# Altium footprint library Module.PcbLib: 57 footprints (part 2 of 4)
Each footprint in its own frame and in the unit in brackets; x right, y up, seen from the top. Pads: shape width x height; smd on the part's side, far side on the other; paste and mask are expansions set on the pad; w line width, h text height; cw(c..) or ccw(c..) is an arc to the next point about the centre after c.
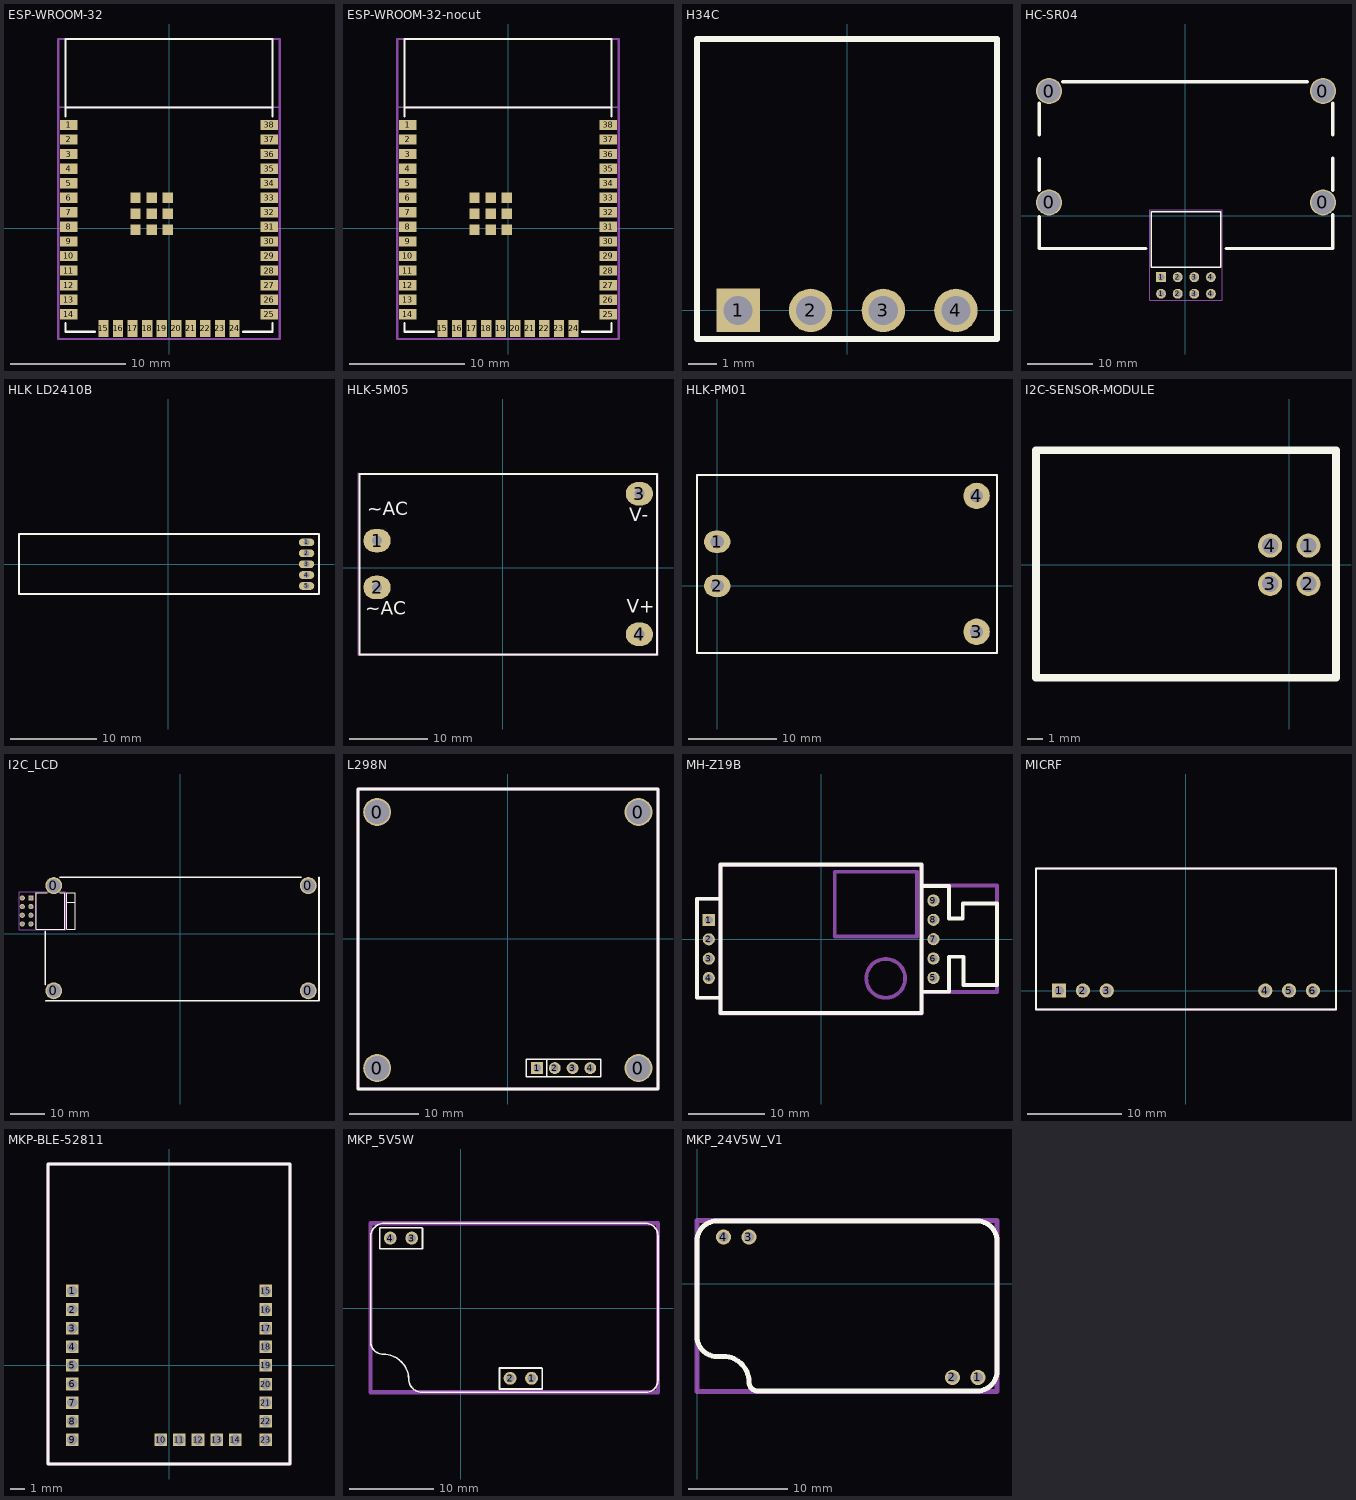
[diagram p1: the footprints below, top view; thin cyan lines are the x and y axes]

## ESP-WROOM-32 [mm]
height 2.8
pads (47):
  rect 1.5x0.9 smd: 1(-8.75,9) 2(-8.75,7.73) 3(-8.75,6.46) 4(-8.75,5.19) 5(-8.75,3.92) 6(-8.75,2.65) 7(-8.75,1.38) 8(-8.75,0.11) 9(-8.75,-1.16) 10(-8.75,-2.43) 11(-8.75,-3.7) 12(-8.75,-4.97) 13(-8.75,-6.24) 14(-8.75,-7.51) 25(8.75,-7.51) 26(8.75,-6.24) 27(8.75,-4.97) 28(8.75,-3.7) 29(8.75,-2.43) 30(8.75,-1.16) 31(8.75,0.11) 32(8.75,1.38) 33(8.75,2.65) 34(8.75,3.92) 35(8.75,5.19) 36(8.75,6.46) 37(8.75,7.73) 38(8.75,9)
  rect 0.9x1.5 smd: 15(-5.717,-8.75) 16(-4.447,-8.75) 17(-3.177,-8.75) 18(-1.907,-8.75) 19(-0.637,-8.75) 20(0.633,-8.75) 21(1.903,-8.75) 22(3.173,-8.75) 23(4.443,-8.75) 24(5.713,-8.75)
  rect 0.9x0.9 smd paste-6: 101(-2.917,-0.144) 101(-2.917,1.256) 101(-2.917,2.656) 101(-1.517,-0.144) 101(-1.517,1.256) 101(-1.517,2.656) 101(-0.117,-0.144) 101(-0.117,1.256) 101(-0.117,2.656)
Top Overlay:
  lines w0.2: -9.017,-8.272 -9.017,-9.034 -6.477,-9.034 ; -9.017,9.762 -9.017,16.493 9.017,16.493 9.017,9.762 ; -9.017,10.524 9.017,10.524 ; 6.477,-9.034 9.017,-9.034 9.017,-8.272
Mechanical 1:
  lines w0.127: -9.652,10.524 9.652,10.524
Mechanical 13:
  lines w0.2: -9.652,-9.669 9.652,-9.669 9.652,16.493 -9.652,16.493 -9.652,-9.669
  text ".Designator" at 0.7,-3.6 h2
3D body "ESP-32 .step": height 2.61, standoff -0.1, extent -8.85,-8.9 9.05,16.5

## ESP-WROOM-32-nocut [mm]
height 2.8
pads (47):
  rect 1.5x0.9 smd: 1(-8.75,9) 2(-8.75,7.73) 3(-8.75,6.46) 4(-8.75,5.19) 5(-8.75,3.92) 6(-8.75,2.65) 7(-8.75,1.38) 8(-8.75,0.11) 9(-8.75,-1.16) 10(-8.75,-2.43) 11(-8.75,-3.7) 12(-8.75,-4.97) 13(-8.75,-6.24) 14(-8.75,-7.51) 25(8.75,-7.51) 26(8.75,-6.24) 27(8.75,-4.97) 28(8.75,-3.7) 29(8.75,-2.43) 30(8.75,-1.16) 31(8.75,0.11) 32(8.75,1.38) 33(8.75,2.65) 34(8.75,3.92) 35(8.75,5.19) 36(8.75,6.46) 37(8.75,7.73) 38(8.75,9)
  rect 0.9x1.5 smd: 15(-5.717,-8.75) 16(-4.447,-8.75) 17(-3.177,-8.75) 18(-1.907,-8.75) 19(-0.637,-8.75) 20(0.633,-8.75) 21(1.903,-8.75) 22(3.173,-8.75) 23(4.443,-8.75) 24(5.713,-8.75)
  rect 0.9x0.9 smd: 101(-2.917,-0.144) 101(-2.917,1.256) 101(-2.917,2.656) 101(-1.517,-0.144) 101(-1.517,1.256) 101(-1.517,2.656) 101(-0.117,-0.144) 101(-0.117,1.256) 101(-0.117,2.656)
Top Overlay:
  lines w0.2: -9.017,-8.272 -9.017,-9.034 -6.477,-9.034 ; -9.017,9.762 -9.017,16.493 9.017,16.493 9.017,9.762 ; -9.017,10.524 9.017,10.524 ; 6.477,-9.034 9.017,-9.034 9.017,-8.272
Mechanical 1:
  lines w0.127: -9.652,10.524 9.652,10.524
Mechanical 13:
  lines w0.2: -9.652,-9.669 -9.652,16.493 9.652,16.493 9.652,-9.669 -9.652,-9.669
  text ".Designator" at 0.7,-3.6 h2
3D body "ESP-32 .step": height 2.61, standoff -0.1, extent -8.85,-8.9 9.05,16.5

## H34C [mm]
pads (4):
  rect 1.52x1.52 hole 1.02: 1(-3.81,0)
  round 1.52 hole 1.02: 2(-1.27,0) 3(1.27,0) 4(3.81,0)
Top Overlay:
  lines w0.2: -5.25,-1 -5.25,9.5 5.25,9.5 5.25,-1 -5.25,-1
Mechanical 13:
  lines w0.2: -5.25,-1 5.25,-1 5.25,9.5 -5.25,9.5 -5.25,-1
Mechanical 15:
  lines w0.2: -5.25,-1 -5.25,9.5 5.25,9.5 5.25,-1 -5.25,-1
3D body: height 1.5, standoff 0, extent -5.2,-1 5.2,9.5

## HC-SR04 [mm]
pads (12):
  round 4 hole 3.5: 0(-20.85,2.012) 0(-20.85,19.075) 0(21.112,2.012) 0(21.112,19.075)
  round 1.52 hole 1.02: 1(-3.679,-11.981) 2(-1.139,-11.981) 2(-1.139,-9.441) 3(1.401,-11.981) 3(1.401,-9.441) 4(3.941,-11.981) 4(3.941,-9.441)
  rect 1.52x1.52 hole 1.02: 1(-3.679,-9.441)
Top Overlay:
  lines w0.2: -5.203,-7.917 5.465,-7.917 5.465,0.605 -5.203,0.605 -5.203,-7.917
  lines w0.5: -22.369,-0.145 -22.369,-5.066 -6,-5.066 ; -22.369,3.829 -22.369,8.75 ; -22.369,12.329 -22.369,17.25 ; -18.75,20.5 18.75,20.5 ; 6.25,-5.066 22.631,-5.066 22.631,0.105 ; 22.632,3.837 22.632,8.758 ; 22.632,12.337 22.632,17.258
Mechanical 15:
  lines w0.1: -5.449,-12.941 5.715,-12.941 5.715,0.855 -5.449,0.855 -5.449,-12.941
3D body "613008243121.stp": height 5.09, standoff -4.46, extent -5.199,-12.235 5.461,0.605
3D body "HC-04HC-04.stp": height 18.2, standoff 0.75, extent -22.369,-5.066 22.631,20.5

## HLK LD2410B [mm]
pads (5):
  oval 1.8x0.9 hole 0.7: 1(16.1,2.52) 2(16.1,1.25) 3(16.1,-0.02) 4(16.1,-1.29) 5(16.1,-2.56)
Top Overlay:
  lines w0.2: -17.4,-3.5 -17.4,3.5 17.55,3.5 17.55,-3.5 -17.4,-3.5
3D body: height 4.6, standoff 0, extent -17.4,-3.5 17.5,3.5

## HLK-5M05 [mm]
pads (4):
  oval 3.5x3 hole 1.3 paste+0 mask+0.051: 1(-16.105,3.508) 2(-16.105,-2.492) 3(17.495,9.508) 4(17.495,-8.492)
Top Overlay:
  lines w0.254: 19.745,-11.049 -18.355,-11.049 -18.355,12.008 19.745,12.008 19.745,-10.992
  text "V+" at 15.873,-6.336 h3
  text "V-" at 16.163,5.414 h3
  text "~AC" at -17.362,6.163 h3
  text "~AC" at -17.612,-6.587 h3
Mechanical 15:
  region: -18.422,12.135 -18.422,12.16 -18.457,12.195 -18.507,12.195 -18.542,12.16 -18.542,12.135 -18.542,12.11 -18.507,12.075 -18.457,12.075 -18.422,12.11
  region: -15.605,3.508 -15.606,3.607 -15.682,3.79 -15.823,3.93 -16.006,4.005 -16.204,4.005 -16.387,3.93 -16.528,3.79 -16.604,3.607 -16.605,3.508 -16.604,3.409 -16.528,3.226 -16.387,3.086 -16.204,3.011 -16.006,3.011 -15.823,3.086 -15.682,3.226 -15.606,3.409
  region: -15.605,-2.492 -15.606,-2.393 -15.682,-2.21 -15.823,-2.07 -16.006,-1.995 -16.204,-1.995 -16.387,-2.07 -16.528,-2.21 -16.604,-2.393 -16.605,-2.492 -16.604,-2.591 -16.528,-2.774 -16.387,-2.914 -16.204,-2.989 -16.006,-2.989 -15.823,-2.914 -15.682,-2.774 -15.606,-2.591
  region: 17.995,9.508 17.994,9.607 17.918,9.79 17.777,9.93 17.594,10.005 17.396,10.005 17.212,9.93 17.072,9.79 16.995,9.607 16.995,9.508 16.995,9.409 17.072,9.226 17.212,9.086 17.396,9.011 17.594,9.011 17.777,9.086 17.918,9.226 17.994,9.409
  region: 17.995,-8.492 17.994,-8.393 17.918,-8.21 17.777,-8.07 17.594,-7.995 17.396,-7.995 17.212,-8.07 17.072,-8.21 16.995,-8.393 16.995,-8.492 16.995,-8.591 17.072,-8.774 17.212,-8.914 17.396,-8.989 17.594,-8.989 17.777,-8.914 17.918,-8.774 17.994,-8.591
  lines w0.051: -18.482,-11.176 -18.482,12.135 19.872,12.135 19.872,-11.176 -18.482,-11.176
3D body "Convertidor AC DC HLK-5M05 .step": height 19.15, standoff -4.15, extent -18.605,-11.049 19.995,12.251

## HLK-5M12 [mm]

## HLK-PM01 [mm]
pads (4):
  oval 3x2.5 hole 1.5: 1(0,5) 2(0,0)
  round 3 hole 1.5: 3(29.4,-5.2) 4(29.4,10.2)
Top Overlay:
  lines w0.254: -2.286,-7.62 31.714,-7.62 31.714,12.58 -2.286,12.58 -2.286,-7.62
Mechanical 13:
  lines w0.254: -2.286,-7.62 -2.286,12.58 31.714,12.58 31.714,-7.62 -2.286,-7.62
  text ".Designator" at 0,0 h3.05
Mechanical 15:
  lines w0.254: -2.286,-7.62 -2.286,12.58 31.714,12.58 31.714,-7.62 -2.286,-7.62
  text ".Comment" at 0,0 h0.64
3D body "User Library-HLK-PM01.STEP": height 15.6, standoff -4.5, extent -2.25,-7.56 31.75,12.64

## I2C-SENSOR-MODULE [mm]
pads (4):
  round 1.6 hole 1.1: 1(1.27,1.27) 2(1.27,-1.27) 3(-1.27,-1.27) 4(-1.27,1.27)
Top Overlay:
  lines w0.5: -16.8,-7.5 3.1,-7.5 3.1,7.6 -16.8,7.6 -16.8,-7.5
3D body "PCB.step": height 5.9, standoff -5.64, extent -16.85,-7.45 3.15,7.55

## I2C_LCD [mm]
pads (13):
  round 5 hole 4: 0(-37.282,-16.79) 0(-37.282,14.21) 0(37.718,-16.79) 0(37.718,14.21)
  round 1.52 hole 1.02: 1(-46.564,10.56) 2(-46.564,8.02) 2(-44.024,8.02) 3(-46.564,5.48) 3(-44.024,5.48) 4(-46.564,2.94) 4(-44.024,2.94)
  rect 1.52x1.52 hole 1.02: 1(-44.024,10.56)
  round 0 all layers, no hole: ""(-39.657,13.21)
Top Overlay:
  lines w0.2: -39.155,12.084 -42.5,12.084 -42.5,1.416 -33.978,1.416 -33.978,12.08 -33.982,12.084 -35.5,12.084 ; -33.52,9.29 -30.98,9.29 ; -33.52,1.42 -33.52,12.08 -30.98,12.08 -30.98,1.42 -33.52,1.42
  lines w0.5: -39.782,-15 -39.782,0.75 ; -35.5,16.71 35.625,16.71 ; 40.864,-19.739 40.853,-19.75 ; 40.875,16.71 40.875,-18.5 40.875,-19.728 40.853,-19.75 ; -39.647,-19.75 -35.5,-19.75 36.125,-19.75 40.853,-19.75 ; -39.647,-19.75 -39.647,-19.75
Mechanical 15:
  lines w0.1: -42.54,1.485 -42.54,12.145 ; -47.524,1.166 -47.524,12.33 -33.728,12.33 -33.728,1.166 -47.524,1.166
3D body "I2C LCD Adapter PCF8574.SLDPRT": height 14.3, standoff 1.15, extent -33.575,-1.9 7.925,16.1
3D body "LCD module 16 X 2 backlight.STEP": height 20.52, standoff 7.31, extent -39.647,-19.75 40.853,16.75
3D body "61300411021.stp": height 11.54, standoff 1.18, extent -36.52,1.67 -30.98,11.83
3D body "613008243121.stp": height 5.09, standoff -4.46, extent -46.818,1.42 -33.978,12.08

## L298N [mm]
pads (8):
  round 4 hole 3.5: 0(-18.75,-18.5) 0(-18.75,18.2) 0(18.7,-18.5) 0(18.7,18.2)
  rect 1.7x1.7 hole 1.1: 1(4.17,-18.5)
  round 1.7 hole 1.1: 2(6.71,-18.5) 3(9.25,-18.5) 4(11.79,-18.5)
Top Overlay:
  lines w0.2: 5.52,-19.77 5.52,-17.23 ; 2.65,-19.77 13.31,-19.77 13.31,-17.23 2.65,-17.23 2.65,-19.77
  lines w0.5: -21.5,-21.5 21.5,-21.5 21.5,21.5 -21.5,21.5 -21.5,-21.5
Mechanical 1:
  lines w0.5: -21.5,-21.5 21.5,-21.5 21.5,21.5 -21.5,21.5 -21.5,-21.5
3D body "61300411821.stp": height 8.51, standoff -3.09, extent 2.65,-19.75 13.31,-17.25
3D body "L298N Driver DC Motor, Stepper Motor.STEP": height 35.71, standoff 7.71, extent -21.5,-21.5 21.5,21.5

## MH-Z19B [mm]
pads (9):
  rect 1.6x1.6 hole 1.1: 1(-14.75,2.52)
  round 1.6 hole 1.1: 2(-14.75,-0.02) 3(-14.75,-2.56) 4(-14.75,-5.1) 5(14.75,-5.08) 6(14.75,-2.54) 7(14.75,0) 8(14.75,2.54) 9(14.75,5.08)
Top Overlay:
  lines w0.5: -13.2,-7.7 -16.3,-7.7 -16.3,5.3 -13.2,5.3 ; 13.2,-6.9 16.8,-6.9 16.8,-2.3 18.7,-2.3 18.7,-6 23.1,-6 23.1,4.7 18.6,4.7 18.6,2.7 16.8,2.7 16.8,7 13.2,7 ; -13.2,5.3 -13.2,9.8 13.2,9.8 13.2,-9.7 -13.2,-9.7 -13.2,5.3
Mechanical 1:
  circle w0.5: c8.485,-5.15 r2.55
  lines w0.5: -13.3,-7.7 -16.3,-7.7 -16.3,5.3 -13.3,5.3 ; 13.215,-6.95 23.085,-6.95 23.085,6.3 23.085,7.05 13.215,7.05 ; -13.215,-9.75 13.215,-9.75 13.215,9.75 -13.215,9.75 -13.215,-9.75 ; 1.785,0.35 1.785,8.85 12.585,8.85 12.585,0.35 1.785,0.35
3D body: height 8.6, standoff 0, extent -13.215,-9.75 13.215,9.75

## MICRF [mm]
pads (6):
  rect 1.52x1.52 hole 1.02: 1(-13.54,0)
  round 1.52 hole 1.02: 2(-11,0) 3(-8.46,0) 4(8.46,0) 5(11,0) 6(13.54,0)
Top Overlay:
  lines w0.2: -16,-2 16,-2 16,0 16,13 -16,13 -16,0 -16,-2
Mechanical 13:
  lines w0.2: -16,-2 -16,0 -16,13 16,13 16,0 16,-2 -16,-2
Mechanical 15:
  lines w0.2: -16,-2 16,-2 16,0 16,13 -16,13 -16,0 -16,-2
3D body: height 1.5, standoff 0, extent -16,-2 16,13

## MKP-BLE-52811 [mm]
pads (23):
  rect 0.86x0.86 hole 0.7: 1(-6.63,5.055) 2(-6.63,3.785) 3(-6.63,2.515) 4(-6.63,1.245) 5(-6.63,-0.025) 6(-6.63,-1.295) 7(-6.63,-2.565) 8(-6.63,-3.835) 9(-6.63,-5.105) 10(-0.585,-5.105) 11(0.685,-5.105) 12(1.955,-5.105) 13(3.225,-5.105) 14(4.495,-5.105) 15(6.578,5.055) 16(6.578,3.785) 17(6.578,2.515) 18(6.578,1.245) 19(6.578,-0.025) 20(6.578,-1.321) 21(6.578,-2.565) 22(6.578,-3.835) 23(6.578,-5.105)
Top Overlay:
  lines w0.2: -8.281,-6.756 -8.281,13.718 8.229,13.718 8.229,-6.756 -8.281,-6.756
Mechanical 1:
  lines w0.05: -0.803,-5.031 -0.728,-5.105
Mechanical 13:
  lines w0.2: -8.281,-6.756 8.229,-6.756 8.229,13.718 -8.281,13.718 -8.281,-6.756
  text ".Designator" at 0.6,-2.1 h2
Mechanical 15:
  lines w0.2: -8.281,-6.756 -8.281,13.718 8.229,13.718 8.229,-6.756 -8.281,-6.756
  text ".Comment" at 0.6,-2.1 h2
3D body "NRF52811_v1.3.step": height 2.1, standoff 0.11, extent -8.331,-6.833 8.179,13.641

## MKP_5V5W [mil]
height 314.96
pads (4):
  round 60 hole 40: 1(329.09,-326.5) 2(229.09,-326.5) 3(-229.09,326.5) 4(-329.09,326.5)
Top Overlay:
  lines w7.87: -420.67,-155.28 ccw(c-361.61,-155.28) -361.61,-214.33 cw(c-361.61,-332.1) -278.34,-248.82 -275.67,-251.5 cw(c-353.32,-329.15) -243.5,-329.15 ccw(c-181.16,-329.15) -181.16,-391.5 861.02,-391.5 ccw(c861.02,-334.6) 917.91,-334.6 917.91,336.85 ccw(c858.86,336.85) 858.86,395.91 -356.88,395.91 ccw(c-356.88,332.12) -420.67,332.12 -420.67,-155.28 ; -378.09,276.49 -378.09,374.49 -181.09,374.49 -179.09,372.49 -179.09,276.49 -378.09,276.49 ; 180.11,-376.5 379.11,-376.5 379.11,-280.5 377.11,-278.5 180.11,-278.5 180.11,-376.5
Mechanical 13:
  lines w19.68: -420.67,-391.5 -420.67,395.91 917.91,395.91 917.91,-391.5 -420.67,-391.5
  text ".Designator" at -3.35,6.14 h118.11
Mechanical 15:
  lines w19.68: -420.67,-391.5 -420.67,395.91 917.91,395.91 917.91,-391.5 -420.67,-391.5
  text ".Comment" at -3.35,6.14 h118.11
3D body "PSU 5W.step": height 597.9, standoff -583.2, extent -420.67,-391.49 917.92,395.91

## MKP_24V5W_V1 [mil]
pads (4):
  round 60 hole 40: 1(1105.91,-369.53) 2(1005.91,-369.53) 3(204.61,183.35) 4(104.61,183.35)
Top Overlay:
  lines w19.68: 0,-208.35 ccw(c78.74,-208.35) 78.74,-287.09 91.85,-287.09 104.33,-287.09 cw(c104.33,-387.36) 204.6,-387.36 ccw(c240.35,-387.36) 240.35,-423.11 1102.36,-423.11 ccw(c1102.36,-344.37) 1181.1,-344.37 1181.1,167.44 ccw(c1102.36,167.44) 1102.36,246.18 78.74,246.18 ccw(c78.74,167.44) 0,167.44 0,-167.44 0,-208.35
Mechanical 13:
  lines w19.68: 0,-425.2 1181.1,-425.2 1181.1,248.03 0,248.03 0,-425.2
  text ".Designator" at 82.68,-102.36 h118.11
Mechanical 15:
  lines w19.68: 0,-425.2 0,248.03 1181.1,248.03 1181.1,-425.2 0,-425.2
  text ".Comment" at 82.68,-102.36 h118.11
3D body "PCB_24V5W1.step": height 591.34, standoff -198.09, extent 0,-423.11 1181.1,246.19